# Altium footprint library Tomra_Cadstar_Footprints.PcbLib: 373 footprints (part 24 of 24)
Each footprint in its own frame and in the unit in brackets; x right, y up, seen from the top. Pads: shape width x height; smd on the part's side, far side on the other; paste and mask are expansions set on the pad; w line width, h text height; cw(c..) or ccw(c..) is an arc to the next point about the centre after c.
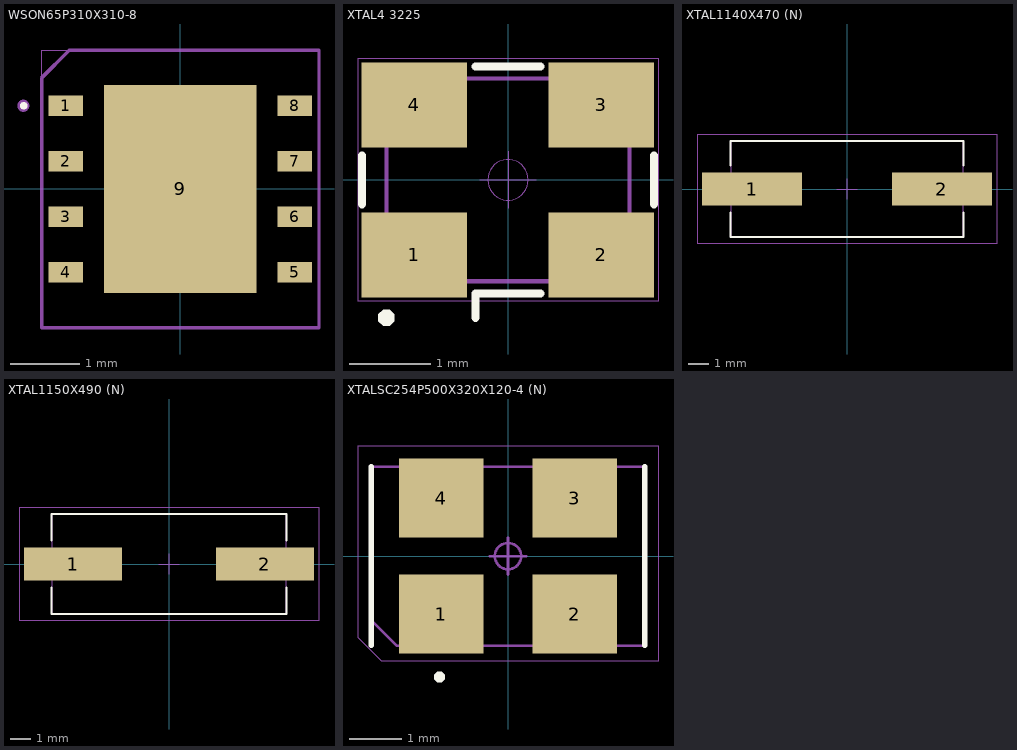
[diagram p23: the footprints below, top view; thin cyan lines are the x and y axes]

## WSON65P310X310-8 [mm]
height 0.8
pads (9):
  rect 0.5x0.3 smd paste+0 mask+0: 1(-1.65,1.2) 2(-1.65,0.4) 3(-1.65,-0.4) 4(-1.65,-1.2) 5(1.65,-1.2) 6(1.65,-0.4) 7(1.65,0.4) 8(1.65,1.2)
  rect 2.2x3 smd paste+0 mask+0: 9(0,0)
Top Silk:
  lines w0.1: -2.263,1.2 cw(c-2.256,1.2) -2.25,1.2 cw(c-2.256,1.2) -2.263,1.2
  text ".Designator" at -3.599,2.35 h0.7
Top Assembly:
  lines w0.05: -2.325,1.2 cw(c-2.262,1.2) -2.2,1.2 cw(c-2.262,1.2) -2.325,1.2 ; -2,-2 -2,1.6 -1.6,2 2,2 2,-2 -2,-2
Top Placement:
  lines w0.01: -2,-2 2,-2 2,2 -2,2 -2,-2

## XTAL4 3225 [mm]
height 0.7
pads (4):
  rect 1.3x1.05 smd paste+0 mask+0: 1(-1.155,-0.925) 2(1.15,-0.925) 3(1.15,0.925) 4(-1.155,0.925)
Top Silk:
  region: -1.6,-1.7 -1.6,-1.659 -1.541,-1.6 -1.459,-1.6 -1.4,-1.659 -1.4,-1.7 -1.4,-1.741 -1.459,-1.8 -1.541,-1.8 -1.6,-1.741
  lines w0.1: -1.8,-0.3 -1.8,0.3 ; -0.4,-1.7 -0.4,-1.4 0.4,-1.4 ; -0.4,1.4 0.4,1.4 ; 1.8,-0.3 1.8,0.3
  text ".Designator" at -3.599,-0.35 h0.7
Top Assembly:
  lines w0.05: -1.5,-1.25 1.5,-1.25 1.5,1.25 -1.495,1.25 -1.5,-0.05 -1.5,-1.25
Top Placement:
  lines w0.01: -0.35,0 0.35,0 ; 0,-0.35 0,0.35 ; -1.85,-1.5 -1.85,1.5 1.85,1.5 1.85,-1.5 -1.85,-1.5 ; -0.25,0 cw(c0,0) 0.25,0 cw(c0,0) -0.25,0

## XTAL1140X470 (N) [mm]
height 4.3
pads (2):
  rect 4.9x1.6 smd paste+0 mask+0: 1(-4.65,0) 2(4.65,0)
Top Silk:
  lines w0.1: -5.7,-1.15 -5.7,-2.35 5.7,-2.35 5.7,-1.15 ; -5.7,1.15 -5.7,2.35 5.7,2.35 5.7,1.15
  text ".Designator" at -3.599,-0.35 h0.7
Top Assembly:
  lines w0.05: -5.7,-2.35 5.7,-2.35 5.7,2.35 -5.7,2.35 -5.7,-2.35
Top Placement:
  lines w0.01: -0.5,0 0.5,0 ; 0,-0.5 0,0.5 ; -7.35,-2.65 7.35,-2.65 7.35,2.65 -7.35,2.65 -7.35,-2.65

## XTAL1150X490 (N) [mm]
height 4.5
pads (2):
  rect 4.8x1.6 smd paste+0 mask+0: 1(-4.7,0) 2(4.7,0)
Top Silk:
  lines w0.1: -5.75,-1.15 -5.75,-2.45 5.75,-2.45 5.75,-1.15 ; -5.75,1.15 -5.75,2.45 5.75,2.45 5.75,1.15
  text ".Designator" at -3.599,-0.35 h0.7
Top Assembly:
  lines w0.05: -5.75,-2.45 5.75,-2.45 5.75,2.45 -5.75,2.45 -5.75,-2.45
Top Placement:
  lines w0.01: -0.5,0 0.5,0 ; 0,-0.5 0,0.5 ; -7.35,-2.75 7.35,-2.75 7.35,2.75 -7.35,2.75 -7.35,-2.75

## XTALSC254P500X320X120-4 (N) [mm]
height 1.2
pads (4):
  rect 1.6x1.5 smd paste+0 mask+0: 1(-1.27,-1.1) 2(1.27,-1.1) 3(1.27,1.1) 4(-1.27,1.1)
Top Silk:
  region: -1.3,-2.4 -1.341,-2.4 -1.4,-2.341 -1.4,-2.259 -1.341,-2.2 -1.3,-2.2 -1.259,-2.2 -1.2,-2.259 -1.2,-2.341 -1.259,-2.4
  lines w0.1: -2.6,-1.7 -2.6,1.7 ; 2.6,-1.7 2.6,1.7
  text ".Designator" at -3.599,-0.35 h0.7
Top Assembly:
  lines w0.05: -2.6,-1.215 -2.115,-1.7 2.6,-1.7 2.6,1.7 -2.6,1.7 -2.6,-1.215
Top Placement:
  lines w0.01: -2.85,-1.55 -2.4,-2 2.85,-2 2.85,2.1 -2.85,2.1 -2.85,-1.55
  lines w0.05: -0.35,0 0.35,0 ; 0,-0.35 0,0.35 ; 0,-0.25 cw(c0,0) 0,0.25 cw(c0,0) 0,-0.25